# Altium schematic symbol library jlcpcb_2025_04_capacitors_extended_1210.schlib: 709 symbols (part 4 of 4)
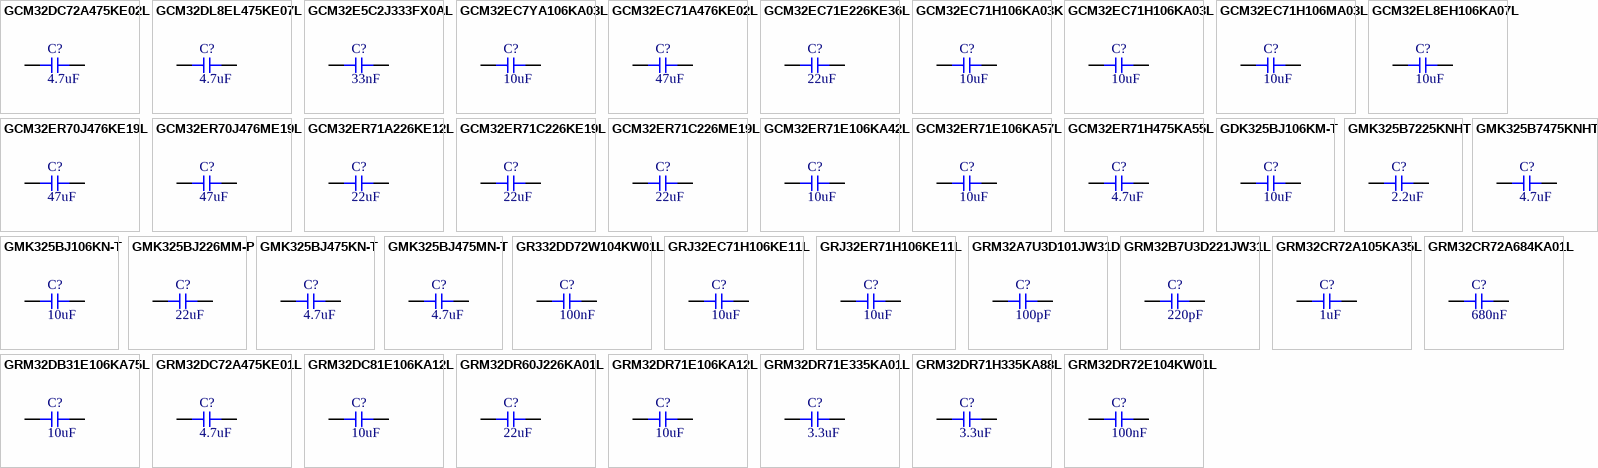
[diagram p20: symbols GCM32DC72A475KE02L to GRM32DR72E104KW01L]

## GRJ32EC71H106KE11L
designator C?  Capacitance: 10uF  (hidden comment: *)
Capacitor, Ceramic (MLCC), 10uF, ±10%, null, X7S, ±10%, SMD 1210; Manufacturer: Murata Electronics; Manufacturer Part Number: GRJ32EC71H106KE11L; Package Size: 1210; JLCPCB Basic Part: No; JLCPCB Part Number: C882548; Supplier 1: LCSC; Category: Capacitors - MLCC; Supplier Part Number 1: C882548; Tolerance: ±10%; Voltage Rating: null; Temperature Coefficient: X7S; RoHS: Yes; ComponentLink1Description: Datasheet; ComponentLink1URL: https://wmsc.lcsc.com/wmsc/upload/file/pdf/v2/lcsc/2201242130_Murata-Electronics-GRJ32EC71H106KE11L_C882548.pdf; ComponentLink2Description: JLCPCB Part URL; ComponentLink2URL: https://jlcpcb.com/partdetail/C882548; ComponentLink3Description: LCSC Part URL; ComponentLink3URL: https://lcsc.com/product-detail/Multilayer-Ceramic-Capacitors-MLCC---SMD-SMT_Murata-Electronics-Murata-Electronics-GRJ32EC71H106KE11L_C882548.html
footprint CAP-1210 (1210 (3225M) Capacitor)
pins: 1, 2

## GRJ32ER71H106KE11L
designator C?  Capacitance: 10uF  (hidden comment: *)
Capacitor, Ceramic (MLCC), 10uF, ±10%, 50V, X7R, ±10%, SMD 1210; Manufacturer: Murata Electronics; Manufacturer Part Number: GRJ32ER71H106KE11L; Package Size: 1210; JLCPCB Basic Part: No; JLCPCB Part Number: C710759; Supplier 1: LCSC; Category: Capacitors - MLCC; Supplier Part Number 1: C710759; Tolerance: ±10%; Voltage Rating: 50V; Temperature Coefficient: X7R; RoHS: Yes; ComponentLink1Description: Datasheet; ComponentLink1URL: https://wmsc.lcsc.com/wmsc/upload/file/pdf/v2/lcsc/2109092236_Murata-Electronics-GRJ32ER71H106KE11L_C710759.pdf; ComponentLink2Description: JLCPCB Part URL; ComponentLink2URL: https://jlcpcb.com/partdetail/C710759; ComponentLink3Description: LCSC Part URL; ComponentLink3URL: https://lcsc.com/product-detail/Multilayer-Ceramic-Capacitors-MLCC---SMD-SMT_Murata-Electronics-Murata-Electronics-GRJ32ER71H106KE11L_C710759.html
footprint CAP-1210 (1210 (3225M) Capacitor)
pins: 1, 2

## GRM32A7U3D101JW31D
designator C?  Capacitance: 100pF  (hidden comment: *)
Capacitor, Ceramic (MLCC), 100pF, ±5%, 2kV, U2J, ±5%, SMD 1210; Manufacturer: Murata Electronics; Manufacturer Part Number: GRM32A7U3D101JW31D; Package Size: 1210; JLCPCB Basic Part: No; JLCPCB Part Number: C440206; Supplier 1: LCSC; Category: Capacitors - MLCC; Supplier Part Number 1: C440206; Tolerance: ±5%; Voltage Rating: 2kV; Temperature Coefficient: U2J; RoHS: Yes; ComponentLink1Description: Datasheet; ComponentLink1URL: https://wmsc.lcsc.com/wmsc/upload/file/pdf/v2/lcsc/2304140030_Murata-Electronics-GRM32A7U3D101JW31D_C440206.pdf; ComponentLink2Description: JLCPCB Part URL; ComponentLink2URL: https://jlcpcb.com/partdetail/C440206; ComponentLink3Description: LCSC Part URL; ComponentLink3URL: https://lcsc.com/product-detail/Multilayer-Ceramic-Capacitors-MLCC---SMD-SMT_Murata-Electronics-Murata-Electronics-GRM32A7U3D101JW31D_C440206.html
footprint CAP-1210 (1210 (3225M) Capacitor)
pins: 1, 2

## GRM32B7U3D221JW31L
designator C?  Capacitance: 220pF  (hidden comment: *)
Capacitor, Ceramic (MLCC), 220pF, ±5%, 2kV, U2J, ±5%, SMD 1210; Manufacturer: Murata Electronics; Manufacturer Part Number: GRM32B7U3D221JW31L; Package Size: 1210; JLCPCB Basic Part: No; JLCPCB Part Number: C527601; Supplier 1: LCSC; Category: Capacitors - MLCC; Supplier Part Number 1: C527601; Tolerance: ±5%; Voltage Rating: 2kV; Temperature Coefficient: U2J; RoHS: Yes; ComponentLink1Description: Datasheet; ComponentLink1URL: https://wmsc.lcsc.com/wmsc/upload/file/pdf/v2/lcsc/2009161207_Murata-Electronics-GRM32B7U3D221JW31L_C527601.pdf; ComponentLink2Description: JLCPCB Part URL; ComponentLink2URL: https://jlcpcb.com/partdetail/C527601; ComponentLink3Description: LCSC Part URL; ComponentLink3URL: https://lcsc.com/product-detail/Multilayer-Ceramic-Capacitors-MLCC---SMD-SMT_Murata-Electronics-Murata-Electronics-GRM32B7U3D221JW31L_C527601.html
footprint CAP-1210 (1210 (3225M) Capacitor)
pins: 1, 2

## GRM32CR72A105KA35L
designator C?  Capacitance: 1uF  (hidden comment: *)
Capacitor, Ceramic (MLCC), 1uF, ±10%, 100V, X7R, ±10%, SMD 1210; Manufacturer: Murata Electronics; Manufacturer Part Number: GRM32CR72A105KA35L; Package Size: 1210; JLCPCB Basic Part: No; JLCPCB Part Number: C91605; Supplier 1: LCSC; Category: Capacitors - MLCC; Supplier Part Number 1: C91605; Tolerance: ±10%; Voltage Rating: 100V; Temperature Coefficient: X7R; RoHS: Yes; ComponentLink1Description: Datasheet; ComponentLink1URL: https://wmsc.lcsc.com/wmsc/upload/file/pdf/v2/lcsc/1810250908_Murata-Electronics-GRM32CR72A105KA35L_C91605.pdf; ComponentLink2Description: JLCPCB Part URL; ComponentLink2URL: https://jlcpcb.com/partdetail/C91605; ComponentLink3Description: LCSC Part URL; ComponentLink3URL: https://lcsc.com/product-detail/Multilayer-Ceramic-Capacitors-MLCC---SMD-SMT_Murata-Electronics-Murata-Electronics-GRM32CR72A105KA35L_C91605.html
footprint CAP-1210 (1210 (3225M) Capacitor)
pins: 1, 2

## GRM32CR72A684KA01L
designator C?  Capacitance: 680nF  (hidden comment: *)
Capacitor, Ceramic (MLCC), 680nF, ±10%, 100V, X7R, ±10%, SMD 1210; Manufacturer: Murata Electronics; Manufacturer Part Number: GRM32CR72A684KA01L; Package Size: 1210; JLCPCB Basic Part: No; JLCPCB Part Number: C711049; Supplier 1: LCSC; Category: Capacitors - MLCC; Supplier Part Number 1: C711049; Tolerance: ±10%; Voltage Rating: 100V; Temperature Coefficient: X7R; RoHS: Yes; ComponentLink1Description: Datasheet; ComponentLink1URL: https://wmsc.lcsc.com/wmsc/upload/file/pdf/v2/lcsc/2109152030_Murata-Electronics-GRM32CR72A684KA01L_C711049.pdf; ComponentLink2Description: JLCPCB Part URL; ComponentLink2URL: https://jlcpcb.com/partdetail/C711049; ComponentLink3Description: LCSC Part URL; ComponentLink3URL: https://lcsc.com/product-detail/Multilayer-Ceramic-Capacitors-MLCC---SMD-SMT_Murata-Electronics-Murata-Electronics-GRM32CR72A684KA01L_C711049.html
footprint CAP-1210 (1210 (3225M) Capacitor)
pins: 1, 2

## GRM32DB31E106KA75L
designator C?  Capacitance: 10uF  (hidden comment: *)
Capacitor, Ceramic (MLCC), 10uF, ±10%, ±10%, SMD 1210; Manufacturer: Murata Electronics; Manufacturer Part Number: GRM32DB31E106KA75L; Package Size: 1210; JLCPCB Basic Part: No; JLCPCB Part Number: C527986; Supplier 1: LCSC; Category: Capacitors - MLCC; Supplier Part Number 1: C527986; Tolerance: ±10%; RoHS: Yes; ComponentLink1Description: Datasheet; ComponentLink1URL: https://wmsc.lcsc.com/wmsc/upload/file/pdf/v2/lcsc/2010291505_Murata-Electronics-GRM32DB31E106KA75L_C527986.pdf; ComponentLink2Description: JLCPCB Part URL; ComponentLink2URL: https://jlcpcb.com/partdetail/C527986; ComponentLink3Description: LCSC Part URL; ComponentLink3URL: https://lcsc.com/product-detail/Multilayer-Ceramic-Capacitors-MLCC---SMD-SMT_Murata-Electronics-Murata-Electronics-GRM32DB31E106KA75L_C527986.html
footprint CAP-1210 (1210 (3225M) Capacitor)
pins: 1, 2

## GRM32DC72A475KE01L
designator C?  Capacitance: 4.7uF  (hidden comment: *)
Capacitor, Ceramic (MLCC), 4.7uF, ±10%, 100V, X7S, ±10%, SMD 1210; Manufacturer: Murata Electronics; Manufacturer Part Number: GRM32DC72A475KE01L; Package Size: 1210; JLCPCB Basic Part: No; JLCPCB Part Number: C437566; Supplier 1: LCSC; Category: Capacitors - MLCC; Supplier Part Number 1: C437566; Tolerance: ±10%; Voltage Rating: 100V; Temperature Coefficient: X7S; RoHS: Yes; ComponentLink1Description: Datasheet; ComponentLink1URL: https://wmsc.lcsc.com/wmsc/upload/file/pdf/v2/lcsc/2304140030_Murata-Electronics-GRM32DC72A475KE01L_C437566.pdf; ComponentLink2Description: JLCPCB Part URL; ComponentLink2URL: https://jlcpcb.com/partdetail/C437566; ComponentLink3Description: LCSC Part URL; ComponentLink3URL: https://lcsc.com/product-detail/Multilayer-Ceramic-Capacitors-MLCC---SMD-SMT_Murata-Electronics-Murata-Electronics-GRM32DC72A475KE01L_C437566.html
footprint CAP-1210 (1210 (3225M) Capacitor)
pins: 1, 2

## GRM32DC81E106KA12L
designator C?  Capacitance: 10uF  (hidden comment: *)
Capacitor, Ceramic (MLCC), 10uF, ±10%, 25V, X6S, ±10%, SMD 1210; Manufacturer: Murata Electronics; Manufacturer Part Number: GRM32DC81E106KA12L; Package Size: 1210; JLCPCB Basic Part: No; JLCPCB Part Number: C363936; Supplier 1: LCSC; Category: Capacitors - MLCC; Supplier Part Number 1: C363936; Tolerance: ±10%; Voltage Rating: 25V; Temperature Coefficient: X6S; RoHS: Yes; ComponentLink1Description: Datasheet; ComponentLink1URL: https://wmsc.lcsc.com/wmsc/upload/file/pdf/v2/lcsc/1912111437_Murata-Electronics-GRM32DC81E106KA12L_C363936.pdf; ComponentLink2Description: JLCPCB Part URL; ComponentLink2URL: https://jlcpcb.com/partdetail/C363936; ComponentLink3Description: LCSC Part URL; ComponentLink3URL: https://lcsc.com/product-detail/Multilayer-Ceramic-Capacitors-MLCC---SMD-SMT_Murata-Electronics-Murata-Electronics-GRM32DC81E106KA12L_C363936.html
footprint CAP-1210 (1210 (3225M) Capacitor)
pins: 1, 2

## GRM32DR60J226KA01L
designator C?  Capacitance: 22uF  (hidden comment: *)
Capacitor, Ceramic (MLCC), 22uF, ±10%, 6.3V, X5R, ±10%, SMD 1210; Manufacturer: Murata Electronics; Manufacturer Part Number: GRM32DR60J226KA01L; Package Size: 1210; JLCPCB Basic Part: No; JLCPCB Part Number: C97964; Supplier 1: LCSC; Category: Capacitors - MLCC; Supplier Part Number 1: C97964; Tolerance: ±10%; Voltage Rating: 6.3V; Temperature Coefficient: X5R; RoHS: Yes; ComponentLink1Description: Datasheet; ComponentLink1URL: https://wmsc.lcsc.com/wmsc/upload/file/pdf/v2/lcsc/1810250911_Murata-Electronics-GRM32DR60J226KA01L_C97964.pdf; ComponentLink2Description: JLCPCB Part URL; ComponentLink2URL: https://jlcpcb.com/partdetail/C97964; ComponentLink3Description: LCSC Part URL; ComponentLink3URL: https://lcsc.com/product-detail/Multilayer-Ceramic-Capacitors-MLCC---SMD-SMT_Murata-Electronics-Murata-Electronics-GRM32DR60J226KA01L_C97964.html
footprint CAP-1210 (1210 (3225M) Capacitor)
pins: 1, 2

## GRM32DR71E106KA12L
designator C?  Capacitance: 10uF  (hidden comment: *)
Capacitor, Ceramic (MLCC), 10uF, ±10%, 25V, X7R, ±10%, SMD 1210; Manufacturer: Murata Electronics; Manufacturer Part Number: GRM32DR71E106KA12L; Package Size: 1210; JLCPCB Basic Part: No; JLCPCB Part Number: C77100; Supplier 1: LCSC; Category: Capacitors - MLCC; Supplier Part Number 1: C77100; Tolerance: ±10%; Voltage Rating: 25V; Temperature Coefficient: X7R; RoHS: Yes; ComponentLink1Description: Datasheet; ComponentLink1URL: https://wmsc.lcsc.com/wmsc/upload/file/pdf/v2/lcsc/2304140030_Murata-Electronics-GRM32DR71E106KA12L_C77100.pdf; ComponentLink2Description: JLCPCB Part URL; ComponentLink2URL: https://jlcpcb.com/partdetail/C77100; ComponentLink3Description: LCSC Part URL; ComponentLink3URL: https://lcsc.com/product-detail/Multilayer-Ceramic-Capacitors-MLCC---SMD-SMT_Murata-Electronics-Murata-Electronics-GRM32DR71E106KA12L_C77100.html
footprint CAP-1210 (1210 (3225M) Capacitor)
pins: 1, 2

## GRM32DR71E335KA01L
designator C?  Capacitance: 3.3uF  (hidden comment: *)
Capacitor, Ceramic (MLCC), 3.3uF, ±10%, 25V, X7R, ±10%, SMD 1210; Manufacturer: Murata Electronics; Manufacturer Part Number: GRM32DR71E335KA01L; Package Size: 1210; JLCPCB Basic Part: No; JLCPCB Part Number: C415389; Supplier 1: LCSC; Category: Capacitors - MLCC; Supplier Part Number 1: C415389; Tolerance: ±10%; Voltage Rating: 25V; Temperature Coefficient: X7R; RoHS: Yes; ComponentLink1Description: Datasheet; ComponentLink1URL: https://wmsc.lcsc.com/wmsc/upload/file/pdf/v2/lcsc/2304140030_Murata-Electronics-GRM32DR71E335KA01L_C415389.pdf; ComponentLink2Description: JLCPCB Part URL; ComponentLink2URL: https://jlcpcb.com/partdetail/C415389; ComponentLink3Description: LCSC Part URL; ComponentLink3URL: https://lcsc.com/product-detail/Multilayer-Ceramic-Capacitors-MLCC---SMD-SMT_Murata-Electronics-Murata-Electronics-GRM32DR71E335KA01L_C415389.html
footprint CAP-1210 (1210 (3225M) Capacitor)
pins: 1, 2

## GRM32DR71H335KA88L
designator C?  Capacitance: 3.3uF  (hidden comment: *)
Capacitor, Ceramic (MLCC), 3.3uF, ±10%, 50V, X7R, ±10%, SMD 1210; Manufacturer: Murata Electronics; Manufacturer Part Number: GRM32DR71H335KA88L; Package Size: 1210; JLCPCB Basic Part: No; JLCPCB Part Number: C397310; Supplier 1: LCSC; Category: Capacitors - MLCC; Supplier Part Number 1: C397310; Tolerance: ±10%; Voltage Rating: 50V; Temperature Coefficient: X7R; RoHS: Yes; ComponentLink1Description: Datasheet; ComponentLink1URL: https://wmsc.lcsc.com/wmsc/upload/file/pdf/v2/lcsc/1912111437_Murata-Electronics-GRM32DR71H335KA88L_C397310.pdf; ComponentLink2Description: JLCPCB Part URL; ComponentLink2URL: https://jlcpcb.com/partdetail/C397310; ComponentLink3Description: LCSC Part URL; ComponentLink3URL: https://lcsc.com/product-detail/Multilayer-Ceramic-Capacitors-MLCC---SMD-SMT_Murata-Electronics-Murata-Electronics-GRM32DR71H335KA88L_C397310.html
footprint CAP-1210 (1210 (3225M) Capacitor)
pins: 1, 2

## GRM32DR72E104KW01L
designator C?  Capacitance: 100nF  (hidden comment: *)
Capacitor, Ceramic (MLCC), 100nF, ±10%, 250V, X7R, ±10%, SMD 1210; Manufacturer: Murata Electronics; Manufacturer Part Number: GRM32DR72E104KW01L; Package Size: 1210; JLCPCB Basic Part: No; JLCPCB Part Number: C97968; Supplier 1: LCSC; Category: Capacitors - MLCC; Supplier Part Number 1: C97968; Tolerance: ±10%; Voltage Rating: 250V; Temperature Coefficient: X7R; RoHS: Yes; ComponentLink1Description: Datasheet; ComponentLink1URL: https://wmsc.lcsc.com/wmsc/upload/file/pdf/v2/lcsc/1811021512_Murata-Electronics-GRM32DR72E104KW01L_C97968.pdf; ComponentLink2Description: JLCPCB Part URL; ComponentLink2URL: https://jlcpcb.com/partdetail/C97968; ComponentLink3Description: LCSC Part URL; ComponentLink3URL: https://lcsc.com/product-detail/Multilayer-Ceramic-Capacitors-MLCC---SMD-SMT_Murata-Electronics-Murata-Electronics-GRM32DR72E104KW01L_C97968.html
footprint CAP-1210 (1210 (3225M) Capacitor)
pins: 1, 2

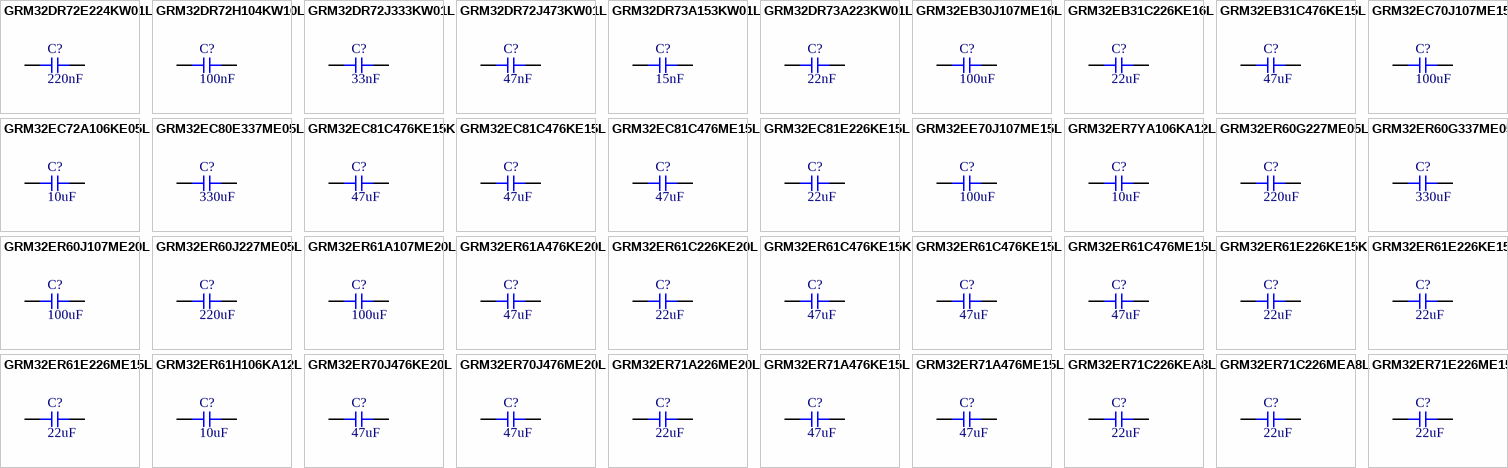
[diagram p14: symbols GRM32DR72E224KW01L to GRM32ER71E226ME15K]

## GRM32DR72E224KW01L
designator C?  Capacitance: 220nF  (hidden comment: *)
Capacitor, Ceramic (MLCC), 220nF, ±10%, 250V, X7R, ±10%, SMD 1210; Manufacturer: Murata Electronics; Manufacturer Part Number: GRM32DR72E224KW01L; Package Size: 1210; JLCPCB Basic Part: No; JLCPCB Part Number: C97969; Supplier 1: LCSC; Category: Capacitors - MLCC; Supplier Part Number 1: C97969; Tolerance: ±10%; Voltage Rating: 250V; Temperature Coefficient: X7R; RoHS: Yes; ComponentLink1Description: Datasheet; ComponentLink1URL: https://wmsc.lcsc.com/wmsc/upload/file/pdf/v2/lcsc/1810250911_Murata-Electronics-GRM32DR72E224KW01L_C97969.pdf; ComponentLink2Description: JLCPCB Part URL; ComponentLink2URL: https://jlcpcb.com/partdetail/C97969; ComponentLink3Description: LCSC Part URL; ComponentLink3URL: https://lcsc.com/product-detail/Multilayer-Ceramic-Capacitors-MLCC---SMD-SMT_Murata-Electronics-Murata-Electronics-GRM32DR72E224KW01L_C97969.html
footprint CAP-1210 (1210 (3225M) Capacitor)
pins: 1, 2

## GRM32DR72H104KW10L
designator C?  Capacitance: 100nF  (hidden comment: *)
Capacitor, Ceramic (MLCC), 100nF, ±10%, 500V, X7R, ±10%, SMD 1210; Manufacturer: Murata Electronics; Manufacturer Part Number: GRM32DR72H104KW10L; Package Size: 1210; JLCPCB Basic Part: No; JLCPCB Part Number: C440207; Supplier 1: LCSC; Category: Capacitors - MLCC; Supplier Part Number 1: C440207; Tolerance: ±10%; Voltage Rating: 500V; Temperature Coefficient: X7R; RoHS: Yes; ComponentLink1Description: Datasheet; ComponentLink1URL: https://wmsc.lcsc.com/wmsc/upload/file/pdf/v2/lcsc/2304140030_Murata-Electronics-GRM32DR72H104KW10L_C440207.pdf; ComponentLink2Description: JLCPCB Part URL; ComponentLink2URL: https://jlcpcb.com/partdetail/C440207; ComponentLink3Description: LCSC Part URL; ComponentLink3URL: https://lcsc.com/product-detail/Multilayer-Ceramic-Capacitors-MLCC---SMD-SMT_Murata-Electronics-Murata-Electronics-GRM32DR72H104KW10L_C440207.html
footprint CAP-1210 (1210 (3225M) Capacitor)
pins: 1, 2

## GRM32DR72J333KW01L
designator C?  Capacitance: 33nF  (hidden comment: *)
Capacitor, Ceramic (MLCC), 33nF, ±10%, 630V, X7R, ±10%, SMD 1210; Manufacturer: Murata Electronics; Manufacturer Part Number: GRM32DR72J333KW01L; Package Size: 1210; JLCPCB Basic Part: No; JLCPCB Part Number: C162506; Supplier 1: LCSC; Category: Capacitors - MLCC; Supplier Part Number 1: C162506; Tolerance: ±10%; Voltage Rating: 630V; Temperature Coefficient: X7R; RoHS: Yes; ComponentLink1Description: Datasheet; ComponentLink1URL: https://wmsc.lcsc.com/wmsc/upload/file/pdf/v2/lcsc/2304140030_Murata-Electronics-GRM32DR72J333KW01L_C162506.pdf; ComponentLink2Description: JLCPCB Part URL; ComponentLink2URL: https://jlcpcb.com/partdetail/C162506; ComponentLink3Description: LCSC Part URL; ComponentLink3URL: https://lcsc.com/product-detail/Multilayer-Ceramic-Capacitors-MLCC---SMD-SMT_Murata-Electronics-Murata-Electronics-GRM32DR72J333KW01L_C162506.html
footprint CAP-1210 (1210 (3225M) Capacitor)
pins: 1, 2

## GRM32DR72J473KW01L
designator C?  Capacitance: 47nF  (hidden comment: *)
Capacitor, Ceramic (MLCC), 47nF, ±10%, 630V, X7R, ±10%, SMD 1210; Manufacturer: Murata Electronics; Manufacturer Part Number: GRM32DR72J473KW01L; Package Size: 1210; JLCPCB Basic Part: No; JLCPCB Part Number: C97970; Supplier 1: LCSC; Category: Capacitors - MLCC; Supplier Part Number 1: C97970; Tolerance: ±10%; Voltage Rating: 630V; Temperature Coefficient: X7R; RoHS: Yes; ComponentLink1Description: Datasheet; ComponentLink1URL: https://wmsc.lcsc.com/wmsc/upload/file/pdf/v2/lcsc/1810250911_Murata-Electronics-GRM32DR72J473KW01L_C97970.pdf; ComponentLink2Description: JLCPCB Part URL; ComponentLink2URL: https://jlcpcb.com/partdetail/C97970; ComponentLink3Description: LCSC Part URL; ComponentLink3URL: https://lcsc.com/product-detail/Multilayer-Ceramic-Capacitors-MLCC---SMD-SMT_Murata-Electronics-Murata-Electronics-GRM32DR72J473KW01L_C97970.html
footprint CAP-1210 (1210 (3225M) Capacitor)
pins: 1, 2

## GRM32DR73A153KW01L
designator C?  Capacitance: 15nF  (hidden comment: *)
Capacitor, Ceramic (MLCC), 15nF, ±10%, 1kV, X7R, ±10%, SMD 1210; Manufacturer: Murata Electronics; Manufacturer Part Number: GRM32DR73A153KW01L; Package Size: 1210; JLCPCB Basic Part: No; JLCPCB Part Number: C913731; Supplier 1: LCSC; Category: Capacitors - MLCC; Supplier Part Number 1: C913731; Tolerance: ±10%; Voltage Rating: 1kV; Temperature Coefficient: X7R; RoHS: Yes; ComponentLink1Description: Datasheet; ComponentLink1URL: https://wmsc.lcsc.com/wmsc/upload/file/pdf/v2/lcsc/2201131300_Murata-Electronics-GRM32DR73A153KW01L_C913731.pdf; ComponentLink2Description: JLCPCB Part URL; ComponentLink2URL: https://jlcpcb.com/partdetail/C913731; ComponentLink3Description: LCSC Part URL; ComponentLink3URL: https://lcsc.com/product-detail/Multilayer-Ceramic-Capacitors-MLCC---SMD-SMT_Murata-Electronics-Murata-Electronics-GRM32DR73A153KW01L_C913731.html
footprint CAP-1210 (1210 (3225M) Capacitor)
pins: 1, 2

## GRM32DR73A223KW01L
designator C?  Capacitance: 22nF  (hidden comment: *)
Capacitor, Ceramic (MLCC), 22nF, ±10%, 1kV, X7R, ±10%, SMD 1210; Manufacturer: Murata Electronics; Manufacturer Part Number: GRM32DR73A223KW01L; Package Size: 1210; JLCPCB Basic Part: No; JLCPCB Part Number: C162507; Supplier 1: LCSC; Category: Capacitors - MLCC; Supplier Part Number 1: C162507; Tolerance: ±10%; Voltage Rating: 1kV; Temperature Coefficient: X7R; RoHS: Yes; ComponentLink1Description: Datasheet; ComponentLink1URL: https://wmsc.lcsc.com/wmsc/upload/file/pdf/v2/lcsc/2304140030_Murata-Electronics-GRM32DR73A223KW01L_C162507.pdf; ComponentLink2Description: JLCPCB Part URL; ComponentLink2URL: https://jlcpcb.com/partdetail/C162507; ComponentLink3Description: LCSC Part URL; ComponentLink3URL: https://lcsc.com/product-detail/Multilayer-Ceramic-Capacitors-MLCC---SMD-SMT_Murata-Electronics-Murata-Electronics-GRM32DR73A223KW01L_C162507.html
footprint CAP-1210 (1210 (3225M) Capacitor)
pins: 1, 2

## GRM32EB30J107ME16L
designator C?  Capacitance: 100uF  (hidden comment: *)
Capacitor, Ceramic (MLCC), 100uF, ±20%, 6.3V, B, ±20%, SMD 1210; Manufacturer: Murata Electronics; Manufacturer Part Number: GRM32EB30J107ME16L; Package Size: 1210; JLCPCB Basic Part: No; JLCPCB Part Number: C415524; Supplier 1: LCSC; Category: Capacitors - MLCC; Supplier Part Number 1: C415524; Tolerance: ±20%; Voltage Rating: 6.3V; Temperature Coefficient: B; RoHS: Yes; ComponentLink1Description: Datasheet; ComponentLink1URL: https://wmsc.lcsc.com/wmsc/upload/file/pdf/v2/lcsc/2304140030_Murata-Electronics-GRM32EB30J107ME16L_C415524.pdf; ComponentLink2Description: JLCPCB Part URL; ComponentLink2URL: https://jlcpcb.com/partdetail/C415524; ComponentLink3Description: LCSC Part URL; ComponentLink3URL: https://lcsc.com/product-detail/Multilayer-Ceramic-Capacitors-MLCC---SMD-SMT_Murata-Electronics-Murata-Electronics-GRM32EB30J107ME16L_C415524.html
footprint CAP-1210 (1210 (3225M) Capacitor)
pins: 1, 2

## GRM32EB31C226KE16L
designator C?  Capacitance: 22uF  (hidden comment: *)
Capacitor, Ceramic (MLCC), 22uF, ±10%, ±10%, SMD 1210; Manufacturer: Murata Electronics; Manufacturer Part Number: GRM32EB31C226KE16L; Package Size: 1210; JLCPCB Basic Part: No; JLCPCB Part Number: C576516; Supplier 1: LCSC; Category: Capacitors - MLCC; Supplier Part Number 1: C576516; Tolerance: ±10%; RoHS: Yes; ComponentLink1Description: Datasheet; ComponentLink1URL: https://wmsc.lcsc.com/wmsc/upload/file/pdf/v2/lcsc/2105241310_Murata-Electronics-GRM32EB31C226KE16L_C576516.pdf; ComponentLink2Description: JLCPCB Part URL; ComponentLink2URL: https://jlcpcb.com/partdetail/C576516; ComponentLink3Description: LCSC Part URL; ComponentLink3URL: https://lcsc.com/product-detail/Multilayer-Ceramic-Capacitors-MLCC---SMD-SMT_Murata-Electronics-Murata-Electronics-GRM32EB31C226KE16L_C576516.html
footprint CAP-1210 (1210 (3225M) Capacitor)
pins: 1, 2

## GRM32EB31C476KE15L
designator C?  Capacitance: 47uF  (hidden comment: *)
Capacitor, Ceramic (MLCC), 47uF, ±10%, 16V, B, ±10%, SMD 1210; Manufacturer: Murata Electronics; Manufacturer Part Number: GRM32EB31C476KE15L; Package Size: 1210; JLCPCB Basic Part: No; JLCPCB Part Number: C162509; Supplier 1: LCSC; Category: Capacitors - MLCC; Supplier Part Number 1: C162509; Tolerance: ±10%; Voltage Rating: 16V; Temperature Coefficient: B; RoHS: Yes; ComponentLink1Description: Datasheet; ComponentLink1URL: https://wmsc.lcsc.com/wmsc/upload/file/pdf/v2/lcsc/2304140030_Murata-Electronics-GRM32EB31C476KE15L_C162509.pdf; ComponentLink2Description: JLCPCB Part URL; ComponentLink2URL: https://jlcpcb.com/partdetail/C162509; ComponentLink3Description: LCSC Part URL; ComponentLink3URL: https://lcsc.com/product-detail/Multilayer-Ceramic-Capacitors-MLCC---SMD-SMT_Murata-Electronics-Murata-Electronics-GRM32EB31C476KE15L_C162509.html
footprint CAP-1210 (1210 (3225M) Capacitor)
pins: 1, 2

## GRM32EC70J107ME15L
designator C?  Capacitance: 100uF  (hidden comment: *)
Capacitor, Ceramic (MLCC), 100uF, ±20%, 6.3V, X7S, ±20%, SMD 1210; Manufacturer: Murata Electronics; Manufacturer Part Number: GRM32EC70J107ME15L; Package Size: 1210; JLCPCB Basic Part: No; JLCPCB Part Number: C393041; Supplier 1: LCSC; Category: Capacitors - MLCC; Supplier Part Number 1: C393041; Tolerance: ±20%; Voltage Rating: 6.3V; Temperature Coefficient: X7S; RoHS: Yes; ComponentLink1Description: Datasheet; ComponentLink1URL: https://wmsc.lcsc.com/wmsc/upload/file/pdf/v2/lcsc/1912111437_Murata-Electronics-GRM32EC70J107ME15L_C393041.pdf; ComponentLink2Description: JLCPCB Part URL; ComponentLink2URL: https://jlcpcb.com/partdetail/C393041; ComponentLink3Description: LCSC Part URL; ComponentLink3URL: https://lcsc.com/product-detail/Multilayer-Ceramic-Capacitors-MLCC---SMD-SMT_Murata-Electronics-Murata-Electronics-GRM32EC70J107ME15L_C393041.html
footprint CAP-1210 (1210 (3225M) Capacitor)
pins: 1, 2

## GRM32EC72A106KE05L
designator C?  Capacitance: 10uF  (hidden comment: *)
Capacitor, Ceramic (MLCC), 10uF, ±10%, 100V, X7S, ±10%, SMD 1210; Manufacturer: Murata Electronics; Manufacturer Part Number: GRM32EC72A106KE05L; Package Size: 1210; JLCPCB Basic Part: No; JLCPCB Part Number: C576517; Supplier 1: LCSC; Category: Capacitors - MLCC; Supplier Part Number 1: C576517; Tolerance: ±10%; Voltage Rating: 100V; Temperature Coefficient: X7S; RoHS: Yes; ComponentLink1Description: Datasheet; ComponentLink1URL: https://wmsc.lcsc.com/wmsc/upload/file/pdf/v2/lcsc/2304140030_Murata-Electronics-GRM32EC72A106KE05L_C576517.pdf; ComponentLink2Description: JLCPCB Part URL; ComponentLink2URL: https://jlcpcb.com/partdetail/C576517; ComponentLink3Description: LCSC Part URL; ComponentLink3URL: https://lcsc.com/product-detail/Multilayer-Ceramic-Capacitors-MLCC---SMD-SMT_Murata-Electronics-Murata-Electronics-GRM32EC72A106KE05L_C576517.html
footprint CAP-1210 (1210 (3225M) Capacitor)
pins: 1, 2

## GRM32EC80E337ME05L
designator C?  Capacitance: 330uF  (hidden comment: *)
Capacitor, Ceramic (MLCC), 330uF, ±20%, 2.5V, X6S, ±20%, SMD 1210; Manufacturer: Murata Electronics; Manufacturer Part Number: GRM32EC80E337ME05L; Package Size: 1210; JLCPCB Basic Part: No; JLCPCB Part Number: C314600; Supplier 1: LCSC; Category: Capacitors - MLCC; Supplier Part Number 1: C314600; Tolerance: ±20%; Voltage Rating: 2.5V; Temperature Coefficient: X6S; RoHS: Yes; ComponentLink1Description: Datasheet; ComponentLink1URL: https://wmsc.lcsc.com/wmsc/upload/file/pdf/v2/lcsc/2206221715_Murata-Electronics-GRM32EC80E337ME05L_C314600.pdf; ComponentLink2Description: JLCPCB Part URL; ComponentLink2URL: https://jlcpcb.com/partdetail/C314600; ComponentLink3Description: LCSC Part URL; ComponentLink3URL: https://lcsc.com/product-detail/Multilayer-Ceramic-Capacitors-MLCC---SMD-SMT_Murata-Electronics-Murata-Electronics-GRM32EC80E337ME05L_C314600.html
footprint CAP-1210 (1210 (3225M) Capacitor)
pins: 1, 2

## GRM32EC81C476KE15K
designator C?  Capacitance: 47uF  (hidden comment: *)
Capacitor, Ceramic (MLCC), 47uF, ±10%, 16V, X6S, ±10%, SMD 1210; Manufacturer: Murata Electronics; Manufacturer Part Number: GRM32EC81C476KE15K; Package Size: 1210; JLCPCB Basic Part: No; JLCPCB Part Number: C3831429; Supplier 1: LCSC; Category: Capacitors - MLCC; Supplier Part Number 1: C3831429; Tolerance: ±10%; Voltage Rating: 16V; Temperature Coefficient: X6S; RoHS: Yes; ComponentLink1Description: Datasheet; ComponentLink1URL: https://wmsc.lcsc.com/wmsc/upload/file/pdf/v2/lcsc/2308111518_Murata-Electronics-GRM32EC81C476KE15K_C3831429.pdf; ComponentLink2Description: JLCPCB Part URL; ComponentLink2URL: https://jlcpcb.com/partdetail/C3831429; ComponentLink3Description: LCSC Part URL; ComponentLink3URL: https://lcsc.com/product-detail/Multilayer-Ceramic-Capacitors-MLCC---SMD-SMT_Murata-Electronics-Murata-Electronics-GRM32EC81C476KE15K_C3831429.html
footprint CAP-1210 (1210 (3225M) Capacitor)
pins: 1, 2

## GRM32EC81C476KE15L
designator C?  Capacitance: 47uF  (hidden comment: *)
Capacitor, Ceramic (MLCC), 47uF, ±10%, 16V, X6S, ±10%, SMD 1210; Manufacturer: Murata Electronics; Manufacturer Part Number: GRM32EC81C476KE15L; Package Size: 1210; JLCPCB Basic Part: No; JLCPCB Part Number: C162512; Supplier 1: LCSC; Category: Capacitors - MLCC; Supplier Part Number 1: C162512; Tolerance: ±10%; Voltage Rating: 16V; Temperature Coefficient: X6S; RoHS: Yes; ComponentLink1Description: Datasheet; ComponentLink1URL: https://wmsc.lcsc.com/wmsc/upload/file/pdf/v2/lcsc/1912111437_Murata-Electronics-GRM32EC81C476KE15L_C162512.pdf; ComponentLink2Description: JLCPCB Part URL; ComponentLink2URL: https://jlcpcb.com/partdetail/C162512; ComponentLink3Description: LCSC Part URL; ComponentLink3URL: https://lcsc.com/product-detail/Multilayer-Ceramic-Capacitors-MLCC---SMD-SMT_Murata-Electronics-Murata-Electronics-GRM32EC81C476KE15L_C162512.html
footprint CAP-1210 (1210 (3225M) Capacitor)
pins: 1, 2

## GRM32EC81C476ME15L
designator C?  Capacitance: 47uF  (hidden comment: *)
Capacitor, Ceramic (MLCC), 47uF, ±20%, 16V, X6S, ±20%, SMD 1210; Manufacturer: Murata Electronics; Manufacturer Part Number: GRM32EC81C476ME15L; Package Size: 1210; JLCPCB Basic Part: No; JLCPCB Part Number: C521068; Supplier 1: LCSC; Category: Capacitors - MLCC; Supplier Part Number 1: C521068; Tolerance: ±20%; Voltage Rating: 16V; Temperature Coefficient: X6S; RoHS: Yes; ComponentLink1Description: Datasheet; ComponentLink1URL: https://wmsc.lcsc.com/wmsc/upload/file/pdf/v2/lcsc/2007231106_Murata-Electronics-GRM32EC81C476ME15L_C521068.pdf; ComponentLink2Description: JLCPCB Part URL; ComponentLink2URL: https://jlcpcb.com/partdetail/C521068; ComponentLink3Description: LCSC Part URL; ComponentLink3URL: https://lcsc.com/product-detail/Multilayer-Ceramic-Capacitors-MLCC---SMD-SMT_Murata-Electronics-Murata-Electronics-GRM32EC81C476ME15L_C521068.html
footprint CAP-1210 (1210 (3225M) Capacitor)
pins: 1, 2

## GRM32EC81E226KE15L
designator C?  Capacitance: 22uF  (hidden comment: *)
Capacitor, Ceramic (MLCC), 22uF, ±10%, 25V, X6S, ±10%, SMD 1210; Manufacturer: Murata Electronics; Manufacturer Part Number: GRM32EC81E226KE15L; Package Size: 1210; JLCPCB Basic Part: No; JLCPCB Part Number: C184990; Supplier 1: LCSC; Category: Capacitors - MLCC; Supplier Part Number 1: C184990; Tolerance: ±10%; Voltage Rating: 25V; Temperature Coefficient: X6S; RoHS: Yes; ComponentLink1Description: Datasheet; ComponentLink1URL: https://wmsc.lcsc.com/wmsc/upload/file/pdf/v2/lcsc/1810250922_Murata-Electronics-GRM32EC81E226KE15L_C184990.pdf; ComponentLink2Description: JLCPCB Part URL; ComponentLink2URL: https://jlcpcb.com/partdetail/C184990; ComponentLink3Description: LCSC Part URL; ComponentLink3URL: https://lcsc.com/product-detail/Multilayer-Ceramic-Capacitors-MLCC---SMD-SMT_Murata-Electronics-Murata-Electronics-GRM32EC81E226KE15L_C184990.html
footprint CAP-1210 (1210 (3225M) Capacitor)
pins: 1, 2

## GRM32EE70J107ME15L
designator C?  Capacitance: 100uF  (hidden comment: *)
Capacitor, Ceramic (MLCC), 100uF, ±20%, 6.3V, X7U, ±20%, SMD 1210; Manufacturer: Murata Electronics; Manufacturer Part Number: GRM32EE70J107ME15L; Package Size: 1210; JLCPCB Basic Part: No; JLCPCB Part Number: C426103; Supplier 1: LCSC; Category: Capacitors - MLCC; Supplier Part Number 1: C426103; Tolerance: ±20%; Voltage Rating: 6.3V; Temperature Coefficient: X7U; RoHS: Yes; ComponentLink1Description: Datasheet; ComponentLink1URL: https://wmsc.lcsc.com/wmsc/upload/file/pdf/v2/lcsc/2304140030_Murata-Electronics-GRM32EE70J107ME15L_C426103.pdf; ComponentLink2Description: JLCPCB Part URL; ComponentLink2URL: https://jlcpcb.com/partdetail/C426103; ComponentLink3Description: LCSC Part URL; ComponentLink3URL: https://lcsc.com/product-detail/Multilayer-Ceramic-Capacitors-MLCC---SMD-SMT_Murata-Electronics-Murata-Electronics-GRM32EE70J107ME15L_C426103.html
footprint CAP-1210 (1210 (3225M) Capacitor)
pins: 1, 2

## GRM32ER7YA106KA12L
designator C?  Capacitance: 10uF  (hidden comment: *)
Capacitor, Ceramic (MLCC), 10uF, ±10%, 35V, X7R, ±10%, SMD 1210; Manufacturer: Murata Electronics; Manufacturer Part Number: GRM32ER7YA106KA12L; Package Size: 1210; JLCPCB Basic Part: No; JLCPCB Part Number: C97973; Supplier 1: LCSC; Category: Capacitors - MLCC; Supplier Part Number 1: C97973; Tolerance: ±10%; Voltage Rating: 35V; Temperature Coefficient: X7R; RoHS: Yes; ComponentLink1Description: Datasheet; ComponentLink1URL: https://wmsc.lcsc.com/wmsc/upload/file/pdf/v2/lcsc/1810250911_Murata-Electronics-GRM32ER7YA106KA12L_C97973.pdf; ComponentLink2Description: JLCPCB Part URL; ComponentLink2URL: https://jlcpcb.com/partdetail/C97973; ComponentLink3Description: LCSC Part URL; ComponentLink3URL: https://lcsc.com/product-detail/Multilayer-Ceramic-Capacitors-MLCC---SMD-SMT_Murata-Electronics-Murata-Electronics-GRM32ER7YA106KA12L_C97973.html
footprint CAP-1210 (1210 (3225M) Capacitor)
pins: 1, 2

## GRM32ER60G227ME05L
designator C?  Capacitance: 220uF  (hidden comment: *)
Capacitor, Ceramic (MLCC), 220uF, ±20%, 4V, X5R, ±20%, SMD 1210; Manufacturer: Murata Electronics; Manufacturer Part Number: GRM32ER60G227ME05L; Package Size: 1210; JLCPCB Basic Part: No; JLCPCB Part Number: C711058; Supplier 1: LCSC; Category: Capacitors - MLCC; Supplier Part Number 1: C711058; Tolerance: ±20%; Voltage Rating: 4V; Temperature Coefficient: X5R; RoHS: Yes; ComponentLink1Description: Datasheet; ComponentLink1URL: https://wmsc.lcsc.com/wmsc/upload/file/pdf/v2/lcsc/2201242200_Murata-Electronics-GRM32ER60G227ME05L_C711058.pdf; ComponentLink2Description: JLCPCB Part URL; ComponentLink2URL: https://jlcpcb.com/partdetail/C711058; ComponentLink3Description: LCSC Part URL; ComponentLink3URL: https://lcsc.com/product-detail/Multilayer-Ceramic-Capacitors-MLCC---SMD-SMT_Murata-Electronics-Murata-Electronics-GRM32ER60G227ME05L_C711058.html
footprint CAP-1210 (1210 (3225M) Capacitor)
pins: 1, 2

## GRM32ER60G337ME05L
designator C?  Capacitance: 330uF  (hidden comment: *)
Capacitor, Ceramic (MLCC), 330uF, ±20%, 4V, X5R, ±20%, SMD 1210; Manufacturer: Murata Electronics; Manufacturer Part Number: GRM32ER60G337ME05L; Package Size: 1210; JLCPCB Basic Part: No; JLCPCB Part Number: C528969; Supplier 1: LCSC; Category: Capacitors - MLCC; Supplier Part Number 1: C528969; Tolerance: ±20%; Voltage Rating: 4V; Temperature Coefficient: X5R; RoHS: Yes; ComponentLink1Description: Datasheet; ComponentLink1URL: https://wmsc.lcsc.com/wmsc/upload/file/pdf/v2/lcsc/2006161532_Murata-Electronics-GRM32ER60G337ME05L_C528969.pdf; ComponentLink2Description: JLCPCB Part URL; ComponentLink2URL: https://jlcpcb.com/partdetail/C528969; ComponentLink3Description: LCSC Part URL; ComponentLink3URL: https://lcsc.com/product-detail/Multilayer-Ceramic-Capacitors-MLCC---SMD-SMT_Murata-Electronics-Murata-Electronics-GRM32ER60G337ME05L_C528969.html
footprint CAP-1210 (1210 (3225M) Capacitor)
pins: 1, 2

## GRM32ER60J107ME20L
designator C?  Capacitance: 100uF  (hidden comment: *)
Capacitor, Ceramic (MLCC), 100uF, ±20%, 6.3V, X5R, ±20%, SMD 1210; Manufacturer: Murata Electronics; Manufacturer Part Number: GRM32ER60J107ME20L; Package Size: 1210; JLCPCB Basic Part: No; JLCPCB Part Number: C88154; Supplier 1: LCSC; Category: Capacitors - MLCC; Supplier Part Number 1: C88154; Tolerance: ±20%; Voltage Rating: 6.3V; Temperature Coefficient: X5R; RoHS: Yes; ComponentLink1Description: Datasheet; ComponentLink1URL: https://wmsc.lcsc.com/wmsc/upload/file/pdf/v2/lcsc/1810250911_Murata-Electronics-GRM32ER60J107ME20L_C88154.pdf; ComponentLink2Description: JLCPCB Part URL; ComponentLink2URL: https://jlcpcb.com/partdetail/C88154; ComponentLink3Description: LCSC Part URL; ComponentLink3URL: https://lcsc.com/product-detail/Multilayer-Ceramic-Capacitors-MLCC---SMD-SMT_Murata-Electronics-Murata-Electronics-GRM32ER60J107ME20L_C88154.html
footprint CAP-1210 (1210 (3225M) Capacitor)
pins: 1, 2

## GRM32ER60J227ME05L
designator C?  Capacitance: 220uF  (hidden comment: *)
Capacitor, Ceramic (MLCC), 220uF, ±20%, 6.3V, X5R, ±20%, SMD 1210; Manufacturer: Murata Electronics; Manufacturer Part Number: GRM32ER60J227ME05L; Package Size: 1210; JLCPCB Basic Part: No; JLCPCB Part Number: C469553; Supplier 1: LCSC; Category: Capacitors - MLCC; Supplier Part Number 1: C469553; Tolerance: ±20%; Voltage Rating: 6.3V; Temperature Coefficient: X5R; RoHS: Yes; ComponentLink1Description: Datasheet; ComponentLink1URL: https://wmsc.lcsc.com/wmsc/upload/file/pdf/v2/lcsc/1912241611_Murata-Electronics-GRM32ER60J227ME05L_C469553.pdf; ComponentLink2Description: JLCPCB Part URL; ComponentLink2URL: https://jlcpcb.com/partdetail/C469553; ComponentLink3Description: LCSC Part URL; ComponentLink3URL: https://lcsc.com/product-detail/Multilayer-Ceramic-Capacitors-MLCC---SMD-SMT_Murata-Electronics-Murata-Electronics-GRM32ER60J227ME05L_C469553.html
footprint CAP-1210 (1210 (3225M) Capacitor)
pins: 1, 2

## GRM32ER61A107ME20L
designator C?  Capacitance: 100uF  (hidden comment: *)
Capacitor, Ceramic (MLCC), 100uF, ±20%, 10V, X5R, ±20%, SMD 1210; Manufacturer: Murata Electronics; Manufacturer Part Number: GRM32ER61A107ME20L; Package Size: 1210; JLCPCB Basic Part: No; JLCPCB Part Number: C84455; Supplier 1: LCSC; Category: Capacitors - MLCC; Supplier Part Number 1: C84455; Tolerance: ±20%; Voltage Rating: 10V; Temperature Coefficient: X5R; RoHS: Yes; ComponentLink1Description: Datasheet; ComponentLink1URL: https://wmsc.lcsc.com/wmsc/upload/file/pdf/v2/lcsc/1810250911_Murata-Electronics-GRM32ER61A107ME20L_C84455.pdf; ComponentLink2Description: JLCPCB Part URL; ComponentLink2URL: https://jlcpcb.com/partdetail/C84455; ComponentLink3Description: LCSC Part URL; ComponentLink3URL: https://lcsc.com/product-detail/Multilayer-Ceramic-Capacitors-MLCC---SMD-SMT_Murata-Electronics-Murata-Electronics-GRM32ER61A107ME20L_C84455.html
footprint CAP-1210 (1210 (3225M) Capacitor)
pins: 1, 2

## GRM32ER61A476KE20L
designator C?  Capacitance: 47uF  (hidden comment: *)
Capacitor, Ceramic (MLCC), 47uF, ±10%, 10V, X5R, ±10%, SMD 1210; Manufacturer: Murata Electronics; Manufacturer Part Number: GRM32ER61A476KE20L; Package Size: 1210; JLCPCB Basic Part: No; JLCPCB Part Number: C397312; Supplier 1: LCSC; Category: Capacitors - MLCC; Supplier Part Number 1: C397312; Tolerance: ±10%; Voltage Rating: 10V; Temperature Coefficient: X5R; RoHS: Yes; ComponentLink1Description: Datasheet; ComponentLink1URL: https://wmsc.lcsc.com/wmsc/upload/file/pdf/v2/lcsc/1912111437_Murata-Electronics-GRM32ER61A476KE20L_C397312.pdf; ComponentLink2Description: JLCPCB Part URL; ComponentLink2URL: https://jlcpcb.com/partdetail/C397312; ComponentLink3Description: LCSC Part URL; ComponentLink3URL: https://lcsc.com/product-detail/Multilayer-Ceramic-Capacitors-MLCC---SMD-SMT_Murata-Electronics-Murata-Electronics-GRM32ER61A476KE20L_C397312.html
footprint CAP-1210 (1210 (3225M) Capacitor)
pins: 1, 2
